# Altium footprint library Connector.PcbLib: 116 footprints (part 8 of 8)
Each footprint in its own frame and in the unit in brackets; x right, y up, seen from the top. Pads: shape width x height; smd on the part's side, far side on the other; paste and mask are expansions set on the pad; w line width, h text height; cw(c..) or ccw(c..) is an arc to the next point about the centre after c.
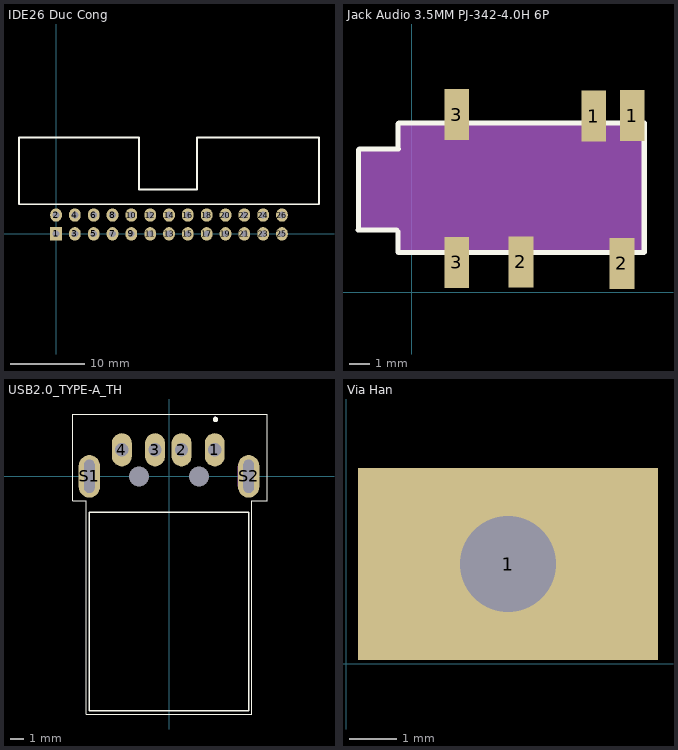
[diagram p7: the footprints below, top view; thin cyan lines are the x and y axes]

## IDE26 Duc Cong [mil]
pads (26):
  rect 62x70.87 hole 36: 1(0,0)
  oval 62x70.87 hole 36: 2(0,100) 3(100,0) 4(100,100) 5(200,0) 6(200,100) 7(300,0) 8(300,100) 9(400,0) 10(400,100) 11(500,0) 12(500,100) 13(600,0) 14(600,100) 15(700,0) 16(700,100) 17(800,0) 18(800,100) 19(900,0) 20(900,100) 21(1000,0) 22(1000,100) 23(1100,0) 24(1100,100) 25(1200,0) 26(1200,100)
Top Overlay:
  lines w10: -196.85,157.48 1396.85,157.48 1396.85,511.81 748.03,511.81 748.03,236.22 440.94,236.22 440.94,511.81 -39.37,511.81 -196.85,511.81 -196.85,157.48

## Jack Audio 3.5MM PJ-342-4.0H 6P [mm]
pads (6):
  rect 1.2x2.5 smd: 1(8.89,8.585) 1(10.77,8.611) 2(5.334,1.473) 2(10.262,1.397) 3(2.21,1.448) 3(2.21,8.661)
Top Overlay:
  lines w0.254: -2.616,3.023 -2.591,3.048 -2.591,6.934 -2.54,6.985 -0.635,6.985 -0.66,7.01 -0.66,8.204 -0.61,8.255 11.354,8.255 11.354,1.956 11.328,1.93 -0.635,1.93 -0.66,1.956 -0.66,2.946 -0.737,3.023 -2.616,3.023
Mechanical 1:
  rectangle: -2.61,2.997 -0.61,6.997
  rectangle: -0.61,1.829 11.39,8.229

## USB2.0_TYPE-A_TH [mm] "USB 2.0 TYPE A"
height 4.5
pads (8):
  oval 1.5x2.5 hole 1: 1(3.449,2) 2(0.949,2) 3(-1.051,2) 4(-3.551,2)
  round 1.1 hole 1.5 unplated: None(-2.25,0) None(2.25,0)
  oval 1.6x3.2 hole 0.8 slot 2.5 at 90 deg: S1(-6,0) S2(6,0)
Top Overlay:
  circle w0.2: c3.499,4.294 r0.1
  lines w0.05: -7.239,-1.85 -6.25,-1.85 -6.25,-17.9 6.25,-17.9 6.25,-1.85 7.391,-1.85 7.391,4.699 -7.239,4.699 -7.239,-1.85
  lines w0.127: -6,-17.65 -6,-2.7 ; -6,-17.65 -6,-2.7 ; -6,-17.65 6,-17.65 ; -6,-17.65 6,-17.65 ; -6,-2.7 6,-2.7 ; -6,-2.7 6,-2.7 ; -6,-2.7 6,-2.7 ; -6,-2.7 6,-2.7 ; 6,-17.65 6,-2.7 ; 6,-17.65 6,-2.7
Mechanical 1:
  lines w0: -6.2,-0.75 ccw(c-5.7,-0.75) -5.2,-0.75 -5.2,0.75 ccw(c-5.7,0.75) -6.2,0.75 -6.2,-0.75 ; 5.2,-0.75 ccw(c5.7,-0.75) 6.2,-0.75 6.2,0.75 ccw(c5.7,0.75) 5.2,0.75 5.2,-0.75
Mechanical 4:
  circle w0.2: c3.499,4.294 r0.1
  circle w0.2: c3.499,4.294 r0.1
3D body "User Library-USB 2_0 Type A Male v2.step": height 4.5, standoff -2.5, extent -6.179,-18.091 6.248,3.511

## Via Han [mil]
pads (1):
  rect 250x160 hole 80: 1(135,83)